# Altium footprint library Library.PcbLib: 298 footprints (part 2 of 19)
Each footprint in its own frame and in the unit in brackets; x right, y up, seen from the top. Pads: shape width x height; smd on the part's side, far side on the other; paste and mask are expansions set on the pad; w line width, h text height; cw(c..) or ccw(c..) is an arc to the next point about the centre after c.
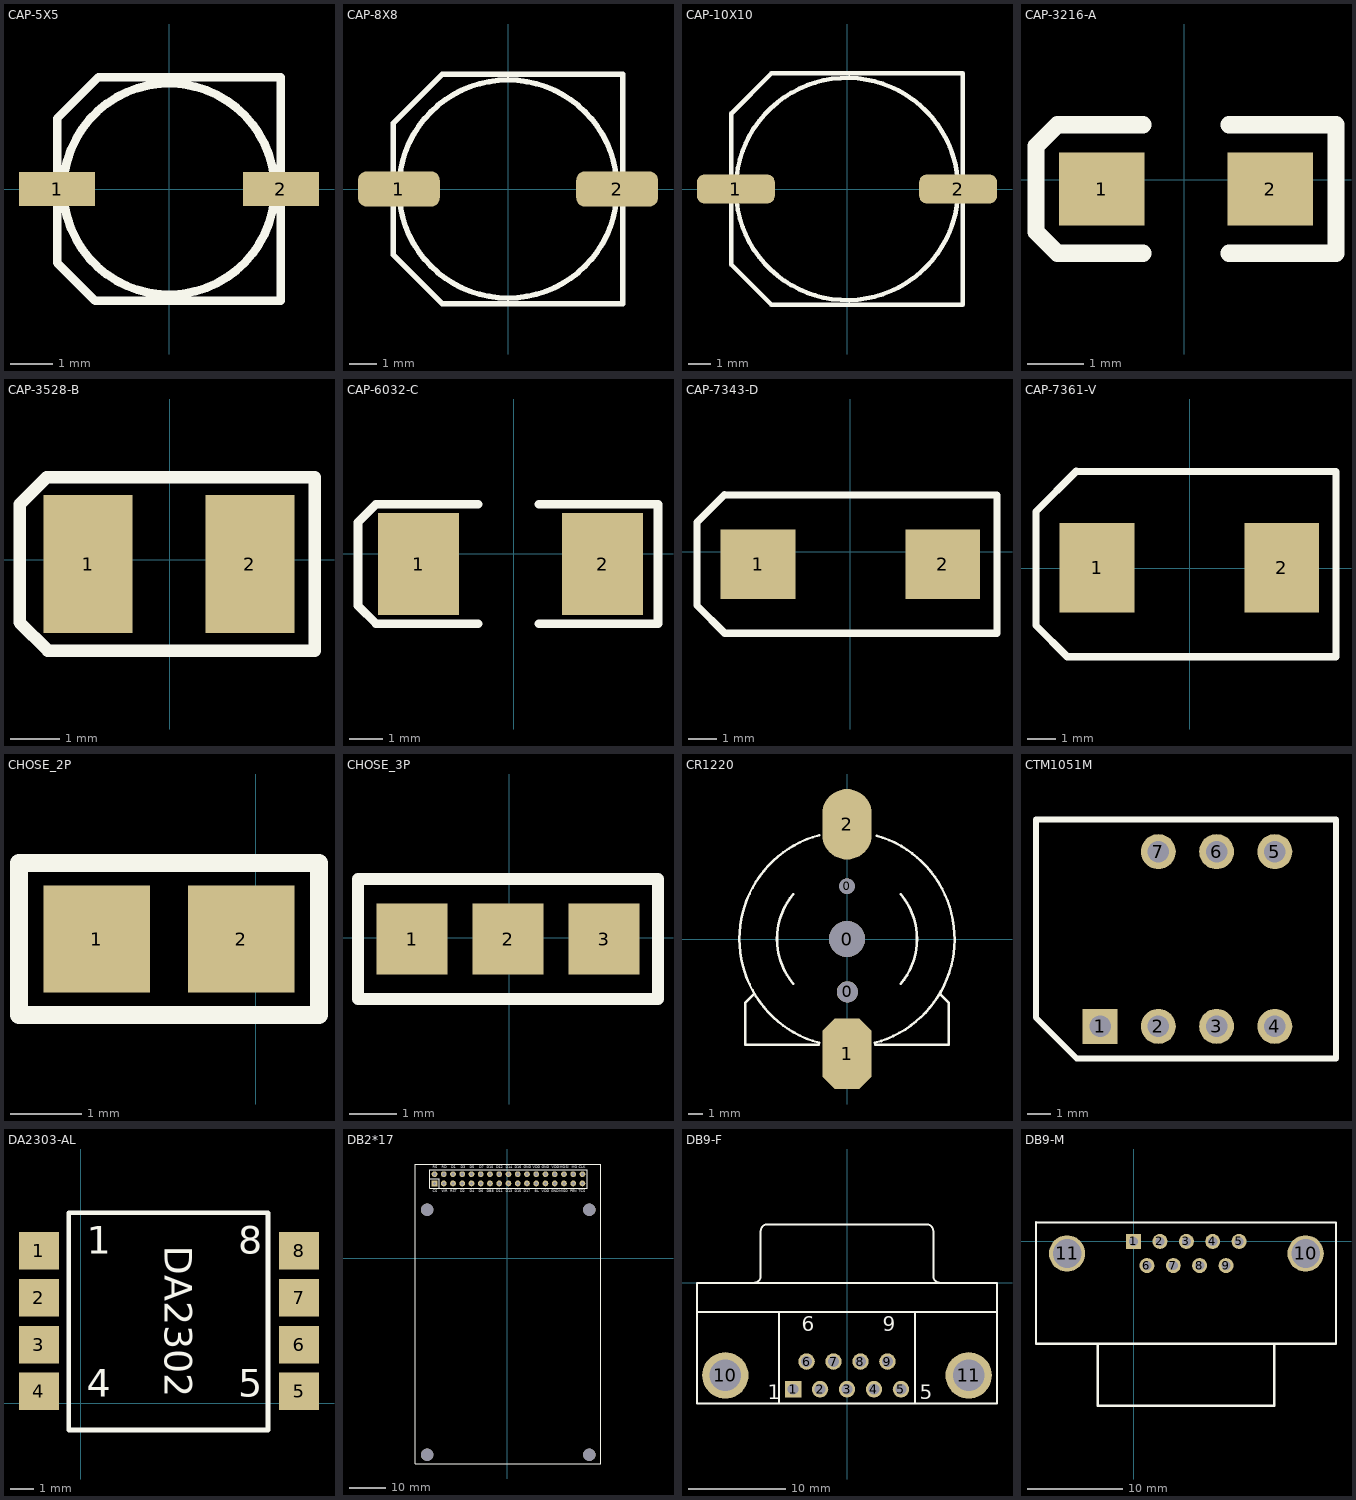
[diagram p1: the footprints below, top view; thin cyan lines are the x and y axes]

## CAP-5X5 [mm]
height 5.5
pads (2):
  rect 1.8x0.8 smd: 1(-2.65,0) 2(2.65,0)
Top Overlay:
  circle w0.2: c0,0 r2.5
  lines w0.2: -2.65,-1.744 -1.744,-2.65 2.65,-2.65 2.65,2.65 -1.668,2.65 -2.65,1.668 -2.65,-1.744
3D body "SL-D.step": height 5.2, standoff 0, extent -2.8,-2.667 2.8,2.633

## CAP-8X8 [mm]
height 10
pads (2):
  rrect50% 3x1.3 smd: 1(-4,0) 2(4,0)
Top Overlay:
  circle w0.2: c0,0 r4
  lines w0.2: -4.2,-2.413 -4.2,2.413 -2.413,4.2 4.2,4.2 4.2,-4.2 -2.413,-4.2 -4.2,-2.413
3D body "SL-H.step": height 10.5, standoff 0, extent -4.521,-4.216 4.479,4.084

## CAP-10X10 [mm]
height 10
pads (2):
  rrect50% 3.5x1.3 smd: 1(-5,0) 2(5,0)
Top Overlay:
  circle w0.2: c0,0 r5
  lines w0.2: -5.2,3.404 -5.2,-3.404 -3.404,-5.2 5.2,-5.2 5.2,5.2 -3.404,5.2 -5.191,3.413
3D body "SW3dPS-capacitor size G.STEP": height 10.21, standoff -0.01, extent -5.775,-5.118 5.825,5.182

## CAP-3216-A [mm] "钽电容"
height 2
pads (2):
  rect 1.524x1.3 smd: 1(-1.464,-0.162) 2(1.533,-0.162)
Top Overlay:
  lines w0.305: -0.727,-1.305 -2.251,-1.305 -2.632,-0.924 -2.632,0.6 -2.251,0.981 -0.727,0.981 ; 0.797,-1.305 2.702,-1.305 2.702,0.981 0.797,0.981
3D body "TAJ-A.STEP": height 1.6, standoff 0, extent -1.565,-0.95 1.635,0.65

## CAP-3528-B [mm] "钽电容"
height 3
pads (2):
  rect 1.8x2.794 smd: 1(-1.653,-0.088) 2(1.623,-0.088)
Top Overlay:
  lines w0.254: -3.038,-1.269 -2.466,-1.84 2.931,-1.84 2.931,1.665 -2.492,1.665 -3.038,1.119 -3.038,-1.269
3D body "TAJ-B.STEP": height 1.9, standoff 0, extent -1.765,-1.488 1.735,1.312

## CAP-6032-C [mil] "钽电容"
pads (2):
  rect 95x120 smd: 1(-111.97,-12.03) 2(104.03,-12.03)
Top Overlay:
  lines w10: -41.97,-82.03 -155.97,-82.03 -161.97,-82.03 -182.97,-61.03 -182.97,36.97 -162.97,56.97 -161.97,57.97 -41.97,57.97 ; 29.03,-82.03 169.03,-82.03 169.03,57.97 29.03,57.97
3D body "TAJ-C.STEP": height 102.36, standoff 0, extent -121.08,-75.02 115.14,50.96

## CAP-7343-D [mm] "钽电容"
height 4
pads (2):
  rect 2.6x2.4 smd: 1(-3.196,-0.437) 2(3.204,-0.437)
Top Overlay:
  lines w0.254: -4.363,-2.831 5.086,-2.831 ; -4.356,-2.832 -5.319,-1.869 -5.319,1.013 -4.363,1.969 5.086,1.962 ; 5.086,-2.832 5.086,1.944
3D body "TAJ-D.STEP": height 2.9, standoff 0, extent -3.644,-2.568 3.656,1.732
3D body: height 0.3, standoff 0, extent 3.314,-1.299 3.518,0.471
3D body: height 0.3, standoff 0, extent -3.481,-1.313 -3.386,0.376

## CAP-7361-V [mm] "钽电容"
pads (2):
  rect 2.6x3.1 smd: 1(-3.202,0.007) 2(3.198,0.007)
Top Overlay:
  lines w0.254: -5.325,-1.99 -5.325,1.965 -3.931,3.359 5.08,3.352 5.08,-3.073 -4.242,-3.073 -5.325,-1.99
3D body "capcp7361x38.step": height 3.45, standoff 0, extent -3.75,-3.048 3.75,3.252

## CHOSE_2P [mm]
pads (2):
  rect 1.5x1.5 smd: 1(-2.235,3.175) 2(-0.203,3.175)
Top Overlay:
  lines w0.254: -3.327,2.108 0.889,2.108 0.889,4.242 -3.327,4.242 -3.327,2.108

## CHOSE_3P [mm]
pads (3):
  rect 1.5x1.5 smd: 1(-2.057,-0.025) 2(-0.025,-0.025) 3(2.007,-0.025)
Top Overlay:
  lines w0.254: -3.2,-1.295 -3.2,1.245 3.15,1.245 3.15,-1.295 -3.2,-1.295

## CR1220 [mm] "钮扣电池"
height 3
pads (5):
  round 2.54 hole 2.54: 0(0,0)
  round 1.1 hole 1.1: 0(0,3.75)
  round 1.5 hole 1.5: 0(0.025,-3.75)
  oct 3.5x5 smd: 1(0,-8.128)
  oval 3.5x5 smd: 2(0,8.128)
Top Overlay:
  lines w0.178: -6.6,-3.9 -7.2,-4.5 -7.2,-7.5 -2,-7.5 ; -3.815,-3.169 cw(c0,0) -3.812,3.172 ; -1.963,-7.363 cw(c0,0) -7.62,0 cw(c0,0) -1.963,7.363 ; 1.963,-7.363 ccw(c0,0) 2.093,7.327 ; 2,-7.5 7.2,-7.5 7.2,-4.5 6.625,-3.925 ; 3.81,-3.175 ccw(c0,0) 3.812,3.172
3D body "cr1220smd.STEP": height 4.94, standoff 0, extent -7.493,-8.885 7.504,9.615

## CTM1051M [mil]
pads (7):
  rect 60x60 hole 37: 1(510,175)
  round 60 hole 37: 2(610,175) 3(710,175) 4(810,175) 5(810,475) 6(710,475) 7(610,475)
Top Overlay:
  lines w10: 400,190 470,120 915,120 915,530 400,530 400,190

## DA2303-AL [mm]
pads (8):
  rect 1.7x1.6 smd: 1(-1.778,6.508) 2(-1.778,4.508) 3(-1.778,2.508) 4(-1.778,0.508) 5(9.322,0.508) 6(9.322,2.508) 7(9.322,4.508) 8(9.322,6.508)
Top Overlay:
  lines w0.203: -0.508,-1.143 -0.508,8.128 8.001,8.128 8.001,-1.143 5.874,-1.143 1.619,-1.143 -0.508,-1.143
  text "DA2302" at 3.175,6.731 h2.03
  text "5" at 6.731,-0.127 h2.03
  text "8" at 6.731,5.969 h2.03
  text "1" at 0.254,5.969 h2.03
  text "4" at 0.254,-0.127 h2.03

## DB2*17 [mil]
pads (38):
  rect 62x62 hole 35: 1(-785,810)
  round 62 hole 35: 2(-785,910) 3(-685,810) 4(-685,910) 5(-585,810) 6(-585,910) 7(-485,810) 8(-485,910) 9(-385,810) 10(-385,910) 11(-285,810) 12(-285,910) 13(-185,810) 14(-185,910) 15(-85,810) 16(-85,910) 17(15,810) 18(15,910) 19(115,810) 20(115,910) 21(215,810) 22(215,910) 23(315,810) 24(315,910) 25(415,810) 26(415,910) 27(515,810) 28(515,910) 29(615,810) 30(615,910) 31(715,810) 32(715,910) 33(815,810) 34(815,910)
  round 133.86 hole 133.86: ""(-865,-2125) ""(-865,525) ""(890,-2125) ""(890,525)
Top Overlay:
  lines w6: -835,860 -735,860 -735,760 ; -835,760 -835,960 865,960 865,760 -835,760
  lines w10: -995,-2220 -990,-2225 1015,-2225 1015,1020 -410,1020 -995,1020 -995,-2220
  text "D16" at 82.13,971.42 h28
  text "DB8" at -218.07,715.51 h28
  text "RS" at -803.7,971.42 h28
  text "CS" at -803.7,715.51 h28
  text "WR" at -705.28,715.51 h28
  text "RST" at -616.69,715.51 h28
  text "D2" at -508.43,715.51 h28
  text "D3" at -503.5,971.42 h28
  text "D4" at -405.08,715.51 h28
  text "D5" at -405.08,971.42 h28
  text "D6" at -306.65,715.51 h28
  text "D7" at -301.73,971.42 h28
  text "D10" at -218.07,971.42 h28
  text "D11" at -114.72,715.51 h28
  text "D15" at 82.13,715.51 h28
  text "D14" at -16.3,971.42 h28
  text "D17" at 180.55,715.51 h28
  text "VDD" at 377.4,715.51 h28
  text "VDD" at 480.75,971.42 h28
  text "GND" at 377.4,971.42 h28
  text "VDD" at 278.98,971.42 h28
  text "D12" at -119.65,971.42 h28
  text "D1" at -601.93,971.42 h28
  text "RD" at -705.28,971.42 h28
  text "GND" at 180.55,971.42 h28
  text "GND" at 475.83,715.51 h28
  text "D13" at -16.3,715.51 h28
  text "PEN" at 682.52,715.51 h28.03
  text "CLK" at 776.02,971.42 h28.03
  text "MOSI" at 569.33,971.42 h28.03
  text "MO" at 697.28,971.42 h28.03
  text "TCS" at 776.02,715.51 h28.03
  text "MISO" at 564.41,715.51 h28.03
  text "BL" at 298.66,715.51 h28

## DB9-F [mm] "DB9母座"
height 12.75
pads (11):
  rect 1.69x1.69 hole 1.09: 1(-5.54,-10.92)
  round 1.69 hole 1.09: 2(-2.77,-10.92) 3(0,-10.92) 4(2.77,-10.92) 5(5.54,-10.92) 6(-4.155,-8.08) 7(-1.385,-8.08) 8(1.385,-8.08) 9(4.155,-8.08)
  round 4.76 hole 3.26: 10(-12.495,-9.5) 11(12.495,-9.5)
Top Overlay:
  lines w0.2: -15.4,-3 15.4,-3 ; -9.56,0.005 ccw(c-9.56,0.7) -8.865,0.7 -8.865,5.3 ; -8.86,5.305 cw(c-8.165,5.305) -8.165,6 8.165,6 cw(c8.165,5.305) 8.86,5.305 ; -7,-12.4 -7,-3 ; 7,-12.4 7,-3 ; 8.865,5.3 8.865,0.7 ccw(c9.56,0.7) 9.56,0.005 ; -15.4,-12.4 -15.4,0 15.4,0 15.4,-12.4 -15.4,-12.4
  text "1" at -8.128,-11.938 h1.5
  text "5" at 7.493,-11.938 h1.5
  text "9" at 3.655,-4.975 h1.5
  text "6" at -4.655,-4.975 h1.5
3D body "User Library-D-Sub-K122439102-Stig-Wahlstrom.STEP": height 12.45, standoff -3.85, extent -15.405,-13.208 15.405,5.992

## DB9-M [mil] "DB9公座"
height 393.7
pads (11):
  rect 62x62 hole 38: 1(0,0)
  round 62 hole 38: 2(109,0) 3(218,0) 4(327,0) 5(436,0) 6(55,-100) 7(164,-100) 8(273,-100) 9(382,-100)
  round 150 hole 118.11: 10(711,-50) 11(-275,-50)
Top Overlay:
  lines w8: -403.54,78.74 836.61,78.74 836.61,-423.23
  lines w10: -403.54,78.74 -403.54,-423.23 836.61,-423.23 ; -147.64,-425 -147.64,-679.13 580.71,-679.13 580.71,-425
3D body: height 314.96, standoff 0, extent -145,-680 580,-425
3D body: height 393.7, standoff 0, extent -405,-425 835,75